# Altium footprint library General.PCBLIB: 231 footprints (part 14 of 15)
Each footprint in its own frame and in the unit in brackets; x right, y up, seen from the top. Pads: shape width x height; smd on the part's side, far side on the other; paste and mask are expansions set on the pad; w line width, h text height; cw(c..) or ccw(c..) is an arc to the next point about the centre after c.
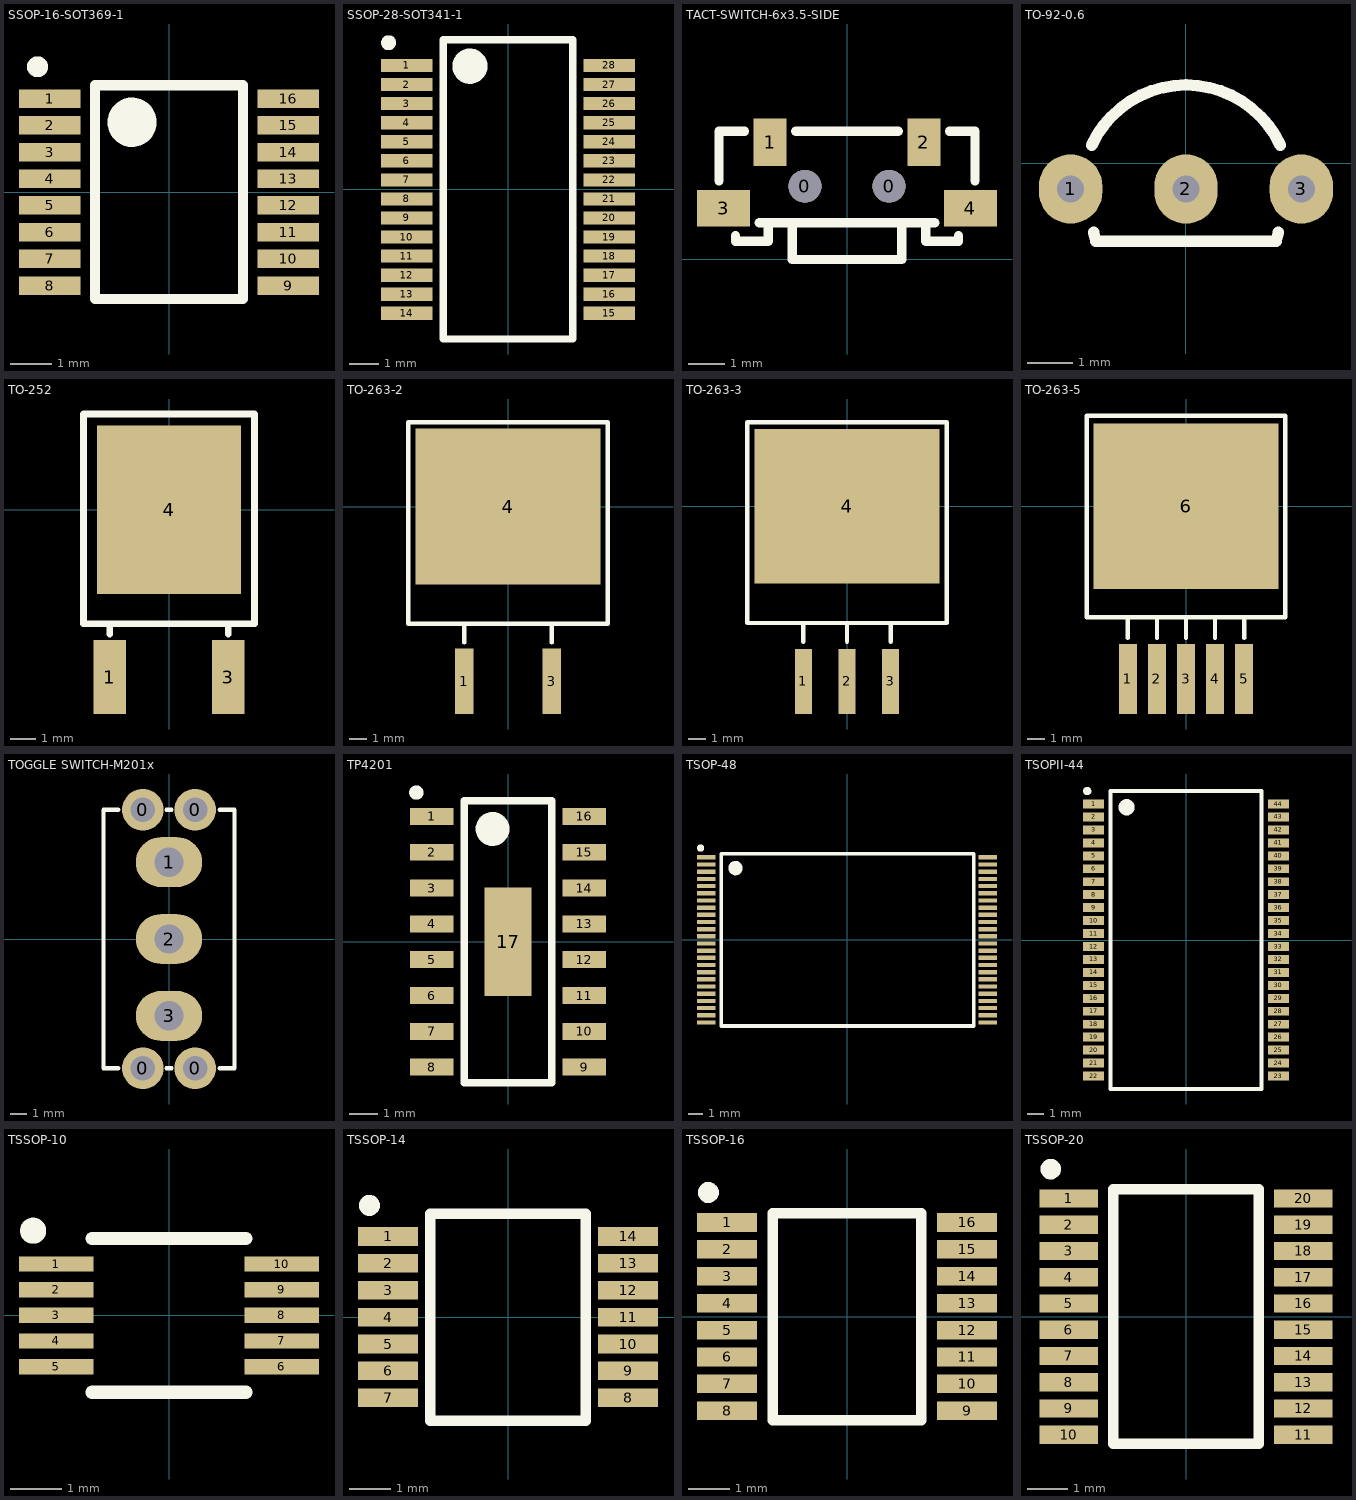
[diagram p13: the footprints below, top view; thin cyan lines are the x and y axes]

## SSOP-16-SOT369-1 [mm] "SSOP, 16PIN, SOT369-1"
height 1.5
pads (16):
  rect 1.5x0.45 smd: 1(-2.9,2.275) 2(-2.9,1.625) 3(-2.9,0.975) 4(-2.9,0.325) 5(-2.9,-0.325) 6(-2.9,-0.975) 7(-2.9,-1.625) 8(-2.9,-2.275) 9(2.9,-2.275) 10(2.9,-1.625) 11(2.9,-0.975) 12(2.9,-0.325) 13(2.9,0.325) 14(2.9,0.975) 15(2.9,1.625) 16(2.9,2.275)
Top Overlay:
  circle w0.6: c-0.9,1.7 r0.3
  circle w0.254: c-3.2,3.05 r0.127
  lines w0.254: -1.8,-2.6 -1.8,2.6 1.8,2.6 1.8,-2.6 -1.8,-2.6
3D body "SOP65P640X150-16N MO-152 SSOP16-SOT369-1.step": height 1.65, standoff 0, extent -3.228,-2.65 3.228,2.65

## SSOP-28-SOT341-1 [mm] "SSOP, 28PIN, SOT341-1"
height 2
pads (28):
  rect 1.75x0.45 smd: 1(-3.45,4.225) 2(-3.45,3.575) 3(-3.45,2.925) 4(-3.45,2.275) 5(-3.45,1.625) 6(-3.45,0.975) 7(-3.45,0.325) 8(-3.45,-0.325) 9(-3.45,-0.975) 10(-3.45,-1.625) 11(-3.45,-2.275) 12(-3.45,-2.925) 13(-3.45,-3.575) 14(-3.45,-4.225) 15(3.45,-4.225) 16(3.45,-3.575) 17(3.45,-2.925) 18(3.45,-2.275) 19(3.45,-1.625) 20(3.45,-0.975) 21(3.45,-0.325) 22(3.45,0.325) 23(3.45,0.975) 24(3.45,1.625) 25(3.45,2.275) 26(3.45,2.925) 27(3.45,3.575) 28(3.45,4.225)
Top Overlay:
  circle w0.254: c-4.07,5 r0.127
  circle w0.6: c-1.3,4.2 r0.3
  lines w0.254: -2.2,-5.1 2.2,-5.1 2.2,5.1 -2.2,5.1 -2.2,-5.1
3D body "SOP65P775X200-28N MO-150 SSOP28-SOT341-1.step": height 2.15, standoff 0, extent -3.903,-5.2 3.903,5.2

## TACT-SWITCH-6x3.5-SIDE [mm] "TACT-SWITCH"
height 3.5
pads (6):
  round 0.9 hole 0.9 unplated: 0(-1.15,2) 0(1.15,2)
  rect 0.9x1.3 smd: 1(-2.1,3.2) 2(2.1,3.2)
  rect 1.45x1 smd: 3(-3.375,1.4) 4(3.375,1.4)
Top Overlay:
  lines w0.254: -3.5,2.15 -3.5,3.5 -2.8,3.5 ; -3.05,0.65 -3.05,0.5 -2.15,0.5 -2.15,1 ; -2.4,1 2.4,1 ; -1.5,1 -1.5,0 1.5,0 1.5,1 ; -1.4,3.5 1.4,3.5 ; 2.15,1 2.15,0.5 3.05,0.5 3.05,0.65 ; 2.8,3.5 3.5,3.5 3.5,2.15
3D body: height 2.5, standoff 1, extent 2.15,0.5 3.05,1
3D body: height 2.5, standoff 1, extent -3.05,0.5 -2.15,1
3D body: height 2.5, standoff 1, extent -1.5,0 1.5,1
3D body: height 3.5, standoff 0, extent -3.5,1 3.5,3.5

## TO-92-0.6 [mm] "TO-92"
height 8
pads (3):
  oval 1.397x1.524 hole 0.6: 1(-2.54,-0.57) 2(0,-0.57) 3(2.54,-0.57)
Top Overlay:
  lines w0.254: -2.075,0.398 cw(c0,-0.57) 2.075,0.398 ; -2.035,-1.52 -1.983,-1.72 1.983,-1.72 2.035,-1.52
3D body "TO-92.STEP": height 10.33, standoff -7.7, extent -2.87,-2.095 2.87,2.095

## TO-252 [mm] "TO-252, DPAK"
height 2.4
pads (3):
  rect 1.25x2.85 smd: 1(-2.28,-6.45) 3(2.28,-6.45)
  rect 5.55x6.5 smd: 4(0,0)
Top Overlay:
  lines w0.254: -2.28,-4.8 -2.28,-4.4 ; 2.28,-4.8 2.28,-4.4 ; -3.3,-4.4 -3.3,3.7 3.3,3.7 3.3,-4.4 -3.3,-4.4
3D body "TO-252(DPAK).STEP": height 2.41, standoff 0, extent -3.27,-7.25 3.27,2.688

## TO-263-2 [mm] "TO-263, D2PAK, 2PIN"
height 4.83
pads (3):
  rect 1.05x3.8 smd: 1(-2.54,-10.15) 3(2.54,-10.15)
  rect 10.75x9.05 smd: 4(0,0)
Top Overlay:
  lines w0.254: -2.54,-7.9 -2.54,-6.8 ; 2.54,-7.9 2.54,-6.8 ; -5.8,-6.8 -5.8,4.9 5.8,4.9 5.8,-6.8 -5.8,-6.8
3D body "TO-263-2(D2PAK).STEP": height 5.01, standoff 0, extent -5.08,-11.392 5.08,3.871

## TO-263-3 [mm] "TO-263, 3PIN"
height 4.83
pads (4):
  rect 1x3.8 smd: 1(-2.54,-10.2) 2(0,-10.2) 3(2.54,-10.2)
  rect 10.75x9 smd: 4(0,0)
Top Overlay:
  lines w0.254: -2.54,-7.9 -2.54,-6.8 ; 0,-7.9 0,-6.8 ; 2.54,-7.9 2.54,-6.8 ; -5.8,-6.8 -5.8,4.9 5.8,4.9 5.8,-6.8 -5.8,-6.8
3D body "TO-263-3.STEP": height 4.69, standoff 0, extent -5.08,-11.52 5.08,3.92

## TO-263-5 [mm] "TO-263, 5PIN"
height 4.83
pads (6):
  rect 1.05x4.1 smd: 1(-3.4,-10.1) 2(-1.7,-10.1) 3(0,-10.1) 4(1.7,-10.1) 5(3.4,-10.1)
  rect 10.8x9.7 smd: 6(0,0)
Top Overlay:
  lines w0.254: -3.4,-7.7 -3.4,-6.5 ; -1.7,-7.7 -1.7,-6.5 ; 0,-7.7 0,-6.5 ; 1.7,-7.7 1.7,-6.5 ; 3.4,-7.7 3.4,-6.5 ; -5.8,-6.5 5.8,-6.5 5.8,5.3 -5.8,5.3 -5.8,-6.5
3D body "TO-263-5.STEP": height 4.56, standoff 0, extent -5.1,-10.1 5.06,3.915

## TOGGLE SWITCH-M201x [mm] "Toggle switch, SPST, NKK"
height 30
pads (7):
  round 2.54 hole 1.5: 0(-1.6,-7.9) 0(-1.6,7.9) 0(1.6,-7.9) 0(1.6,7.9)
  oval 4.064x3.048 hole 1.8: 1(0,4.7) 2(0,0) 3(0,-4.7)
Top Overlay:
  lines w0.254: -3.1,-7.9 -4,-7.9 -4,7.9 -3.1,7.9 ; -0.15,-7.9 0.15,-7.9 ; -0.15,7.9 0.15,7.9 ; 3.1,-7.9 4,-7.9 4,7.9 3.1,7.9
3D body "TOGGLE_SWITCH-SPST.STEP": height 28.44, standoff -3.94, extent -3.429,-6.35 3.431,6.364

## TP4201 [mm] "TP4201, ESOP16L, 16PIN"
height 1.75
pads (17):
  rect 1.55x0.6 smd: 1(-2.7,4.445) 2(-2.7,3.175) 3(-2.7,1.905) 4(-2.7,0.635) 5(-2.7,-0.635) 6(-2.7,-1.905) 7(-2.7,-3.175) 8(-2.7,-4.445) 9(2.7,-4.445) 10(2.7,-3.175) 11(2.7,-1.905) 12(2.7,-0.635) 13(2.7,0.635) 14(2.7,1.905) 15(2.7,3.175) 16(2.7,4.445)
  rect 1.67x3.86 smd: 17(0,0)
Top Overlay:
  circle w0.6: c-0.55,4 r0.3
  circle w0.254: c-3.25,5.29 r0.127
  lines w0.254: -1.55,-5 -1.55,5 1.55,5 1.55,-5 -1.55,-5
3D body "SOIC127P600X175-16AN.STEP": height 1.9, standoff 0, extent -3.03,-5 3.026,5

## TSOP-48 [mm] "TSOP, 48PIN"
height 1.2
pads (48):
  rect 1.3x0.3 smd: 1(-9.8,5.75) 2(-9.8,5.25) 3(-9.8,4.75) 4(-9.8,4.25) 5(-9.8,3.75) 6(-9.8,3.25) 7(-9.8,2.75) 8(-9.8,2.25) 9(-9.8,1.75) 10(-9.8,1.25) 11(-9.8,0.75) 12(-9.8,0.25) 13(-9.8,-0.25) 14(-9.8,-0.75) 15(-9.8,-1.25) 16(-9.8,-1.75) 17(-9.8,-2.25) 18(-9.8,-2.75) 19(-9.8,-3.25) 20(-9.8,-3.75) 21(-9.8,-4.25) 22(-9.8,-4.75) 23(-9.8,-5.25) 24(-9.8,-5.75) 25(9.8,-5.75) 26(9.8,-5.25) 27(9.8,-4.75) 28(9.8,-4.25) 29(9.8,-3.75) 30(9.8,-3.25) 31(9.8,-2.75) 32(9.8,-2.25) 33(9.8,-1.75) 34(9.8,-1.25) 35(9.8,-0.75) 36(9.8,-0.25) 37(9.8,0.25) 38(9.8,0.75) 39(9.8,1.25) 40(9.8,1.75) 41(9.8,2.25) 42(9.8,2.75) 43(9.8,3.25) 44(9.8,3.75) 45(9.8,4.25) 46(9.8,4.75) 47(9.8,5.25) 48(9.8,5.75)
Top Overlay:
  circle w0.254: c-10.2,6.4 r0.127
  circle w0.5: c-7.77,5 r0.25
  lines w0.254: 8.77,-6 -8.77,-6 -8.77,6 8.77,6 ; 8.825,-6 8.825,6
3D body "SOP50P2000X120-48N.STEP": height 1.35, standoff 0, extent -10.03,-6.05 10.026,6.05

## TSOPII-44 [mm] "TSOP, Type II, 44PIN"
height 1.2
pads (44):
  rect 1.3x0.55 smd: 1(-5.7,8.4) 2(-5.7,7.6) 3(-5.7,6.8) 4(-5.7,6) 5(-5.7,5.2) 6(-5.7,4.4) 7(-5.7,3.6) 8(-5.7,2.8) 9(-5.7,2) 10(-5.7,1.2) 11(-5.7,0.4) 12(-5.7,-0.4) 13(-5.7,-1.2) 14(-5.7,-2) 15(-5.7,-2.8) 16(-5.7,-3.6) 17(-5.7,-4.4) 18(-5.7,-5.2) 19(-5.7,-6) 20(-5.7,-6.8) 21(-5.7,-7.6) 22(-5.7,-8.4) 23(5.7,-8.4) 24(5.7,-7.6) 25(5.7,-6.8) 26(5.7,-6) 27(5.7,-5.2) 28(5.7,-4.4) 29(5.7,-3.6) 30(5.7,-2.8) 31(5.7,-2) 32(5.7,-1.2) 33(5.7,-0.4) 34(5.7,0.4) 35(5.7,1.2) 36(5.7,2) 37(5.7,2.8) 38(5.7,3.6) 39(5.7,4.4) 40(5.7,5.2) 41(5.7,6) 42(5.7,6.8) 43(5.7,7.6) 44(5.7,8.4)
Top Overlay:
  circle w0.254: c-6.1,9.2 r0.127
  circle w0.5: c-3.67,8.2 r0.25
  lines w0.254: -4.67,-9.2 -4.67,9.2 4.67,9.2 4.67,-9.2 -4.67,-9.2
3D body "SOP80P1176X120-44N.STEP": height 1.35, standoff 0, extent -5.91,-9.27 5.906,9.27

## TSSOP-10 [mm] "TSSOP, 10PIN"
height 1.1
pads (10):
  rect 1.45x0.3 smd: 1(-2.2,1) 2(-2.2,0.5) 3(-2.2,0) 4(-2.2,-0.5) 5(-2.2,-1) 6(2.2,-1) 7(2.2,-0.5) 8(2.2,0) 9(2.2,0.5) 10(2.2,1)
Top Overlay:
  circle w0.254: c-2.65,1.65 r0.127
  lines w0.254: -1.5,-1.5 1.5,-1.5 ; -1.5,1.5 1.5,1.5
3D body "MSOP-10-LINEAR.STEP": height 1.1, standoff 0, extent -2.45,-1.5 2.45,1.5

## TSSOP-14 [mm] "TSSOP, 14PIN"
height 1.1
pads (14):
  rect 1.45x0.45 smd: 1(-2.9,1.95) 2(-2.9,1.3) 3(-2.9,0.65) 4(-2.9,0) 5(-2.9,-0.65) 6(-2.9,-1.3) 7(-2.9,-1.95) 8(2.9,-1.95) 9(2.9,-1.3) 10(2.9,-0.65) 11(2.9,0) 12(2.9,0.65) 13(2.9,1.3) 14(2.9,1.95)
Top Overlay:
  circle w0.254: c-3.35,2.7 r0.127
  lines w0.254: -1.875,-2.5 1.875,-2.5 1.875,2.5 -1.875,2.5 -1.875,-2.5
3D body "SOP65P640X110-14AN.STEP": height 1.25, standoff 0, extent -3.23,-2.56 3.226,2.54

## TSSOP-16 [mm] "TSSOP, 16PIN"
height 1.1
pads (16):
  rect 1.45x0.45 smd: 1(-2.9,2.275) 2(-2.9,1.625) 3(-2.9,0.975) 4(-2.9,0.325) 5(-2.9,-0.325) 6(-2.9,-0.975) 7(-2.9,-1.625) 8(-2.9,-2.275) 9(2.9,-2.275) 10(2.9,-1.625) 11(2.9,-0.975) 12(2.9,-0.325) 13(2.9,0.325) 14(2.9,0.975) 15(2.9,1.625) 16(2.9,2.275)
Top Overlay:
  circle w0.254: c-3.35,3 r0.127
  lines w0.254: -1.8,-2.5 1.8,-2.5 1.8,2.5 -1.8,2.5 -1.8,-2.5
3D body "SOP65P640X110-16N.STEP": height 1.25, standoff 0, extent -3.23,-2.55 3.226,2.55

## TSSOP-20 [mm] "TSSOP, 20PIN"
height 1.1
pads (20):
  rect 1.45x0.45 smd: 1(-2.9,2.925) 2(-2.9,2.275) 3(-2.9,1.625) 4(-2.9,0.975) 5(-2.9,0.325) 6(-2.9,-0.325) 7(-2.9,-0.975) 8(-2.9,-1.625) 9(-2.9,-2.275) 10(-2.9,-2.925) 11(2.9,-2.925) 12(2.9,-2.275) 13(2.9,-1.625) 14(2.9,-0.975) 15(2.9,-0.325) 16(2.9,0.325) 17(2.9,0.975) 18(2.9,1.625) 19(2.9,2.275) 20(2.9,2.925)
Top Overlay:
  circle w0.254: c-3.35,3.65 r0.127
  lines w0.254: -1.8,-3.15 -1.8,3.15 1.8,3.15 1.8,-3.15 -1.8,-3.15
3D body "SOP65P640X110-20AN MO-153AC F Package.STEP": height 1.25, standoff 0, extent -3.228,-3.3 3.228,3.3